# Altium footprint library TarabusLib_KOR.PcbLib: 560 footprints (part 32 of 35)
Each footprint in its own frame and in the unit in brackets; x right, y up, seen from the top. Pads: shape width x height; smd on the part's side, far side on the other; paste and mask are expansions set on the pad; w line width, h text height; cw(c..) or ccw(c..) is an arc to the next point about the centre after c.
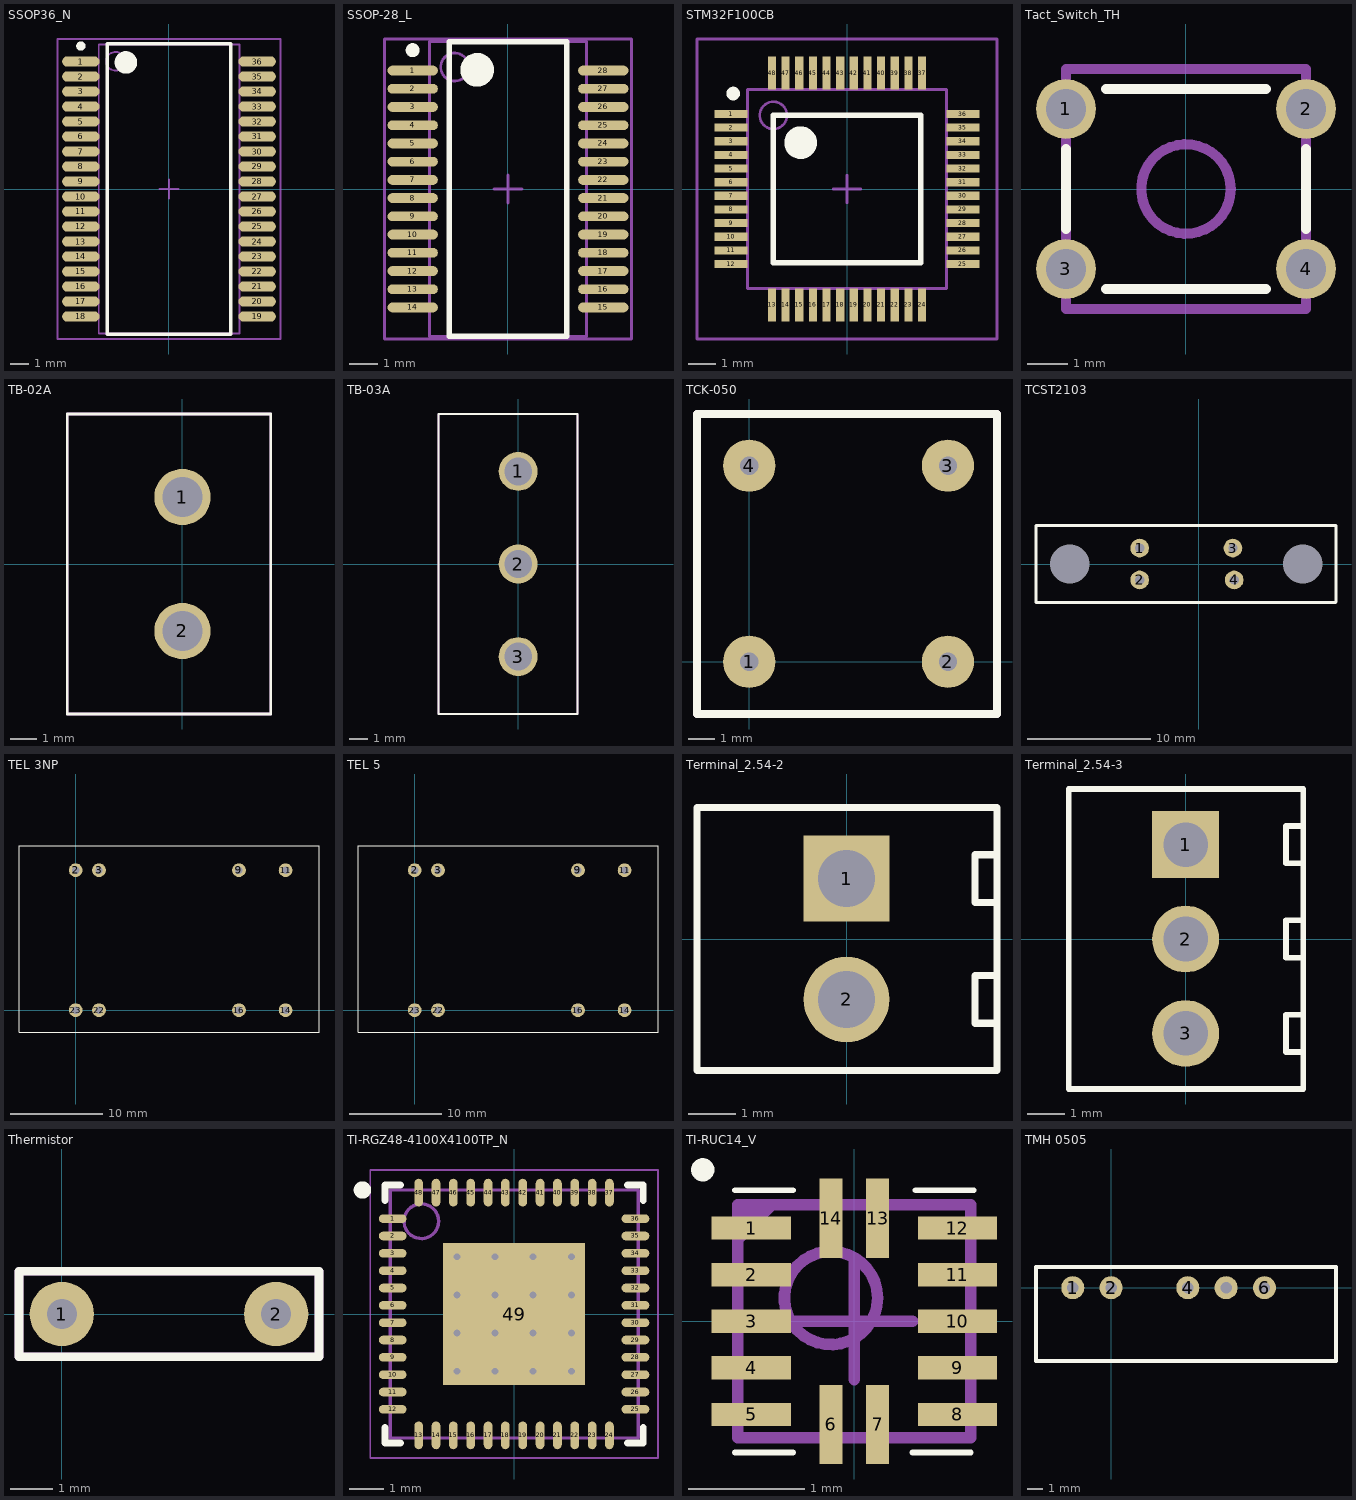
[diagram p31: the footprints below, top view; thin cyan lines are the x and y axes]

## SSOP36_N [mm] "36-Pin Small Outline Package 0.8 mm Pitch, IPC Medium Density"
height 2.65
pads (36):
  oval 2x0.55 smd: 1(-4.7,6.8) 2(-4.7,6) 3(-4.7,5.2) 4(-4.7,4.4) 5(-4.7,3.6) 6(-4.7,2.8) 7(-4.7,2) 8(-4.7,1.2) 9(-4.7,0.4) 10(-4.7,-0.4) 11(-4.7,-1.2) 12(-4.7,-2) 13(-4.7,-2.8) 14(-4.7,-3.6) 15(-4.7,-4.4) 16(-4.7,-5.2) 17(-4.7,-6) 18(-4.7,-6.8) 19(4.7,-6.8) 20(4.7,-6) 21(4.7,-5.2) 22(4.7,-4.4) 23(4.7,-3.6) 24(4.7,-2.8) 25(4.7,-2) 26(4.7,-1.2) 27(4.7,-0.4) 28(4.7,0.4) 29(4.7,1.2) 30(4.7,2) 31(4.7,2.8) 32(4.7,3.6) 33(4.7,4.4) 34(4.7,5.2) 35(4.7,6) 36(4.7,6.8)
Top Overlay:
  circle w0.25: c-4.7,7.625 r0.125
  circle w0.6: c-2.3,6.75 r0.3
  lines w0.2: -3.3,-7.75 -3.3,7.75 3.3,7.75 3.3,-7.75 -3.3,-7.75
Mechanical 13:
  circle w0.1: c-2.85,6.81 r0.5
  lines w0.1: -3.75,-7.71 -3.75,7.71 3.75,7.71 3.75,-7.71 -3.75,-7.71
Mechanical 15:
  lines w0.1: -0.5,0 0.5,0 ; 0,-0.5 0,0.5 ; -5.95,-8 -5.95,8 5.95,8 5.95,-8 -5.95,-8
3D body: height 2.65, standoff 0, extent -3.75,-7.71 3.75,7.71

## SSOP-28_L [mm] "SOP, 28-Leads, Body 10.2x5.3mm, Pitch 0.65mm, IPC High Density"
height 2
pads (28):
  oval 1.8x0.35 smd: 1(-3.4,4.225) 2(-3.4,3.575) 3(-3.4,2.925) 4(-3.4,2.275) 5(-3.4,1.625) 6(-3.4,0.975) 7(-3.4,0.325) 8(-3.4,-0.325) 9(-3.4,-0.975) 10(-3.4,-1.625) 11(-3.4,-2.275) 12(-3.4,-2.925) 13(-3.4,-3.575) 14(-3.4,-4.225) 15(3.4,-4.225) 16(3.4,-3.575) 17(3.4,-2.925) 18(3.4,-2.275) 19(3.4,-1.625) 20(3.4,-0.975) 21(3.4,-0.325) 22(3.4,0.325) 23(3.4,0.975) 24(3.4,1.625) 25(3.4,2.275) 26(3.4,2.925) 27(3.4,3.575) 28(3.4,4.225)
Top Overlay:
  circle w0.25: c-3.4,4.95 r0.125
  circle w0.6: c-1.1,4.25 r0.3
  lines w0.2: -2.1,-5.25 -2.1,5.25 2.1,5.25 2.1,-5.25 -2.1,-5.25
Mechanical 13:
  circle w0.1: c-1.9,4.35 r0.5
  lines w0.1: -2.8,-5.25 -2.8,5.25 2.8,5.25 2.8,-5.25 -2.8,-5.25
Mechanical 15:
  lines w0.1: -0.5,0 0.5,0 ; 0,-0.5 0,0.5 ; -4.4,-5.35 -4.4,5.35 4.4,5.35 4.4,-5.35 -4.4,-5.35
3D body "User Library-SSOP-28-2.STEP": height 1.95, standoff -0.05, extent -3.906,-5.075 3.906,5.125

## STM32F100CB [mm] "TSQFP, 48-Leads, Body 9,7x9,7mm (max), Pitch 0,50mm, IPC Medium Density"
height 1.6
pads (48):
  rect 1.2x0.3 smd: 1(-4.25,2.75) 2(-4.25,2.25) 3(-4.25,1.75) 4(-4.25,1.25) 5(-4.25,0.75) 6(-4.25,0.25) 7(-4.25,-0.25) 8(-4.25,-0.75) 9(-4.25,-1.25) 10(-4.25,-1.75) 11(-4.25,-2.25) 12(-4.25,-2.75) 25(4.25,-2.75) 26(4.25,-2.25) 27(4.25,-1.75) 28(4.25,-1.25) 29(4.25,-0.75) 30(4.25,-0.25) 31(4.25,0.25) 32(4.25,0.75) 33(4.25,1.25) 34(4.25,1.75) 35(4.25,2.25) 36(4.25,2.75)
  rect 0.3x1.2 smd: 13(-2.75,-4.25) 14(-2.25,-4.25) 15(-1.75,-4.25) 16(-1.25,-4.25) 17(-0.75,-4.25) 18(-0.25,-4.25) 19(0.25,-4.25) 20(0.75,-4.25) 21(1.25,-4.25) 22(1.75,-4.25) 23(2.25,-4.25) 24(2.75,-4.25) 37(2.75,4.25) 38(2.25,4.25) 39(1.75,4.25) 40(1.25,4.25) 41(0.75,4.25) 42(0.25,4.25) 43(-0.25,4.25) 44(-0.75,4.25) 45(-1.25,4.25) 46(-1.75,4.25) 47(-2.25,4.25) 48(-2.75,4.25)
Top Overlay:
  circle w0.25: c-4.175,3.5 r0.125
  circle w0.6: c-1.7,1.7 r0.3
  lines w0.2: -2.7,-2.7 -2.7,2.7 2.7,2.7 2.7,-2.7 -2.7,-2.7
Mechanical 13:
  circle w0.1: c-2.7,2.7 r0.5
  lines w0.1: -3.65,-3.65 -3.65,3.65 3.65,3.65 3.65,-3.65 -3.65,-3.65
Mechanical 15:
  lines w0.1: -0.5,0 0.5,0 ; 0,-0.5 0,0.5 ; -5.5,-5.5 -5.5,5.5 5.5,5.5 5.5,-5.5 -5.5,-5.5
3D body: height 1.6, standoff 0.05, extent -3.65,-3.65 3.65,3.65

## Tact_Switch_TH [mm]
height 5
pads (4):
  round 1.5 hole 1 mask+0.075: 1(-3,2) 2(3,2) 3(-3,-2) 4(3,-2)
Top Overlay:
  lines w0.254: -3,-1 -3,1 ; -2,-2.5 2,-2.5 ; -2,2.5 2,2.5 ; 3,-1 3,1
Mechanical 9:
  circle w0.254: c0,0 r1.118
  lines w0.254: -3,-3 3,-3 3,3 -3,3 -3,-3
3D body: height 4, standoff 0, extent -1.118,-1.118 1.118,1.118
3D body: height 3.5, standoff 0.05, extent -3,-3 3,3

## TB-02A [mm]
pads (2):
  round 2.1 hole 1.5: 1(0,2.5) 2(0,-2.5)
Top Overlay:
  lines w0.1: -4.3,-5.6 3.3,-5.6 3.3,5.6 -4.3,5.6 -4.3,-5.6
Mechanical 7:
  lines w0.1: -4.3,-5.6 3.3,-5.6 3.3,5.6 -4.3,5.6 -4.3,-5.6
3D body "c-1776244-2-o-3d.stp": height 10, standoff -3.5, extent -4.25,-5.58 3.25,5.58

## TB-03A [mm]
pads (3):
  round 2.1 hole 1.5: 1(0,5) 2(0,0) 3(0,-5)
Top Overlay:
  lines w0.1: -4.3,-8.1 3.2,-8.1 3.2,8.1 -4.3,8.1 -4.3,-8.1
Mechanical 7:
  lines w0.1: -4.3,-8.1 3.2,-8.1 3.2,8.1 -4.3,8.1 -4.3,-8.1
3D body "c-1776244-3-o-3d.stp": height 10, standoff -3.5, extent -4.3,-8.08 3.2,8.08

## TCK-050 [mm]
pads (4):
  round 2 hole 0.7: 1(0,0) 2(7.62,0) 3(7.62,7.52) 4(0,7.52)
Top Overlay:
  lines w0.3: -2,-2 9.5,-2 9.5,9.5 -2,9.5 -2,-2
Mechanical 7:
  lines w0.3: -2,-2 9.5,-2 9.5,9.5 -2,9.5 -2,-2
Mechanical 10:
  text ".Designator" at 6.5,11 h0.8
  text ".Comment" at 6.5,10 h0.6
3D body: height 8.8, standoff 0, extent -2,-2 9.5,9.5

## TCST2103 [mil]
pads (6):
  round 60 hole 30: 1(-188.98,51.18) 2(-188.98,-51.18) 3(110.24,51.18) 4(114.17,-51.18)
  round 60 hole 125.98 unplated: ""(-413.39,0) ""(334.65,0)
Top Overlay:
  lines w10: -521.65,-124.01 -521.65,124.02 440.94,124.02 440.94,-122.05 438.98,-124.01 -521.65,-124.01
3D body "TCST2103, Оптопара.STEP": height 437.01, standoff -307.09, extent -521.65,-124.01 442.92,124.02

## TEL 3NP [mm] "Traco Power DC/DC converter"
height 10.5
pads (8):
  round 1.5 hole 0.81: 2(0,15.24) 3(2.54,15.24) 9(17.78,15.24) 11(22.86,15.24) 14(22.86,0) 16(17.78,0) 22(2.54,0) 23(0,0)
Top Overlay:
  lines w0.1: -6.175,-2.4 26.5,-2.4 26.5,17.9 -6.175,17.9 -6.175,-2.4
3D body "TEL 3-1211NP.STEP": height 10.2, standoff -4.5, extent -5.8,-2.375 26.2,17.625

## TEL 5 [mm] "Traco Power DC/DC converter"
height 10.5
pads (8):
  round 1.5 hole 0.81: 2(0,15.24) 3(2.54,15.24) 9(17.78,15.24) 11(22.86,15.24) 14(22.86,0) 16(17.78,0) 22(2.54,0) 23(0,0)
Top Overlay:
  lines w0.1: -6.175,-2.4 -6.175,17.9 26.5,17.9 26.5,-2.4 -6.175,-2.4
3D body "TEL 3-1211NP.STEP": height 10.2, standoff -4.5, extent -5.8,-2.375 26.2,17.625

## Terminal_2.54-2 [mm]
height 8.5
pads (2):
  rect 1.8x1.8 hole 1.2: 1(0,1.27)
  round 1.8 hole 1.2: 2(0,-1.27)
Top Overlay:
  lines w0.15: 3.16,-1.77 2.7,-1.77 2.7,-0.77 3.16,-0.77 ; 3.16,0.77 2.7,0.77 2.7,1.77 3.16,1.77 ; -3.14,-2.765 -3.14,2.765 3.16,2.765 3.16,-2.765 -3.14,-2.765
Mechanical 9:
  text ".Comment" at -1.15,3.275 h0.6
  text ".Designator" at -1.175,3.975 h0.8
Mechanical 11:
  lines w0.1: 3.16,-1.77 2.7,-1.77 2.7,-0.77 3.16,-0.77 ; 3.16,0.77 2.7,0.77 2.7,1.77 3.16,1.77 ; -3.14,-2.765 3.16,-2.765 3.16,2.765 -3.14,2.765 -3.14,-2.765
3D body "terminal 2_54x2.STEP": height 8.5, standoff -3.5, extent -3.075,-2.775 3.125,2.765

## Terminal_2.54-3 [mm]
height 8.5
pads (3):
  rect 1.8x1.8 hole 1.2: 1(0,2.54)
  round 1.8 hole 1.2: 2(0,0) 3(0,-2.54)
Top Overlay:
  lines w0.15: 3.16,-3.04 2.7,-3.04 2.7,-2.04 3.16,-2.04 ; 3.16,-0.5 2.7,-0.5 2.7,0.5 3.16,0.5 ; 3.16,2.04 2.7,2.04 2.7,3.04 3.16,3.04 ; -3.14,-4.035 -3.14,4.035 3.16,4.035 3.16,-4.035 -3.14,-4.035
Mechanical 9:
  text ".Comment" at -1.15,4.545 h0.6
  text ".Designator" at -1.175,5.245 h0.8
Mechanical 11:
  lines w0.1: 3.16,-3.04 2.7,-3.04 2.7,-2.04 3.16,-2.04 ; 3.16,-0.5 2.7,-0.5 2.7,0.5 3.16,0.5 ; 3.16,2.04 2.7,2.04 2.7,3.04 3.16,3.04 ; -3.14,-4.035 3.16,-4.035 3.16,4.035 -3.14,4.035 -3.14,-4.035
3D body "terminal 2_54x3.stp": height 8.5, standoff -3.5, extent -3.1,-4.04 3.1,4.04

## Thermistor [mm]
pads (2):
  round 1.5 hole 0.7: 1(0,0) 2(5,0)
Top Overlay:
  lines w0.2: -1,-1 6,-1 6,1 -1,1 -1,-1
Mechanical 7:
  lines w0.2: -1,-1 -1,1 6,1 6,-1 -1,-1
Mechanical 10:
  text ".Designator" at 2.57,1.53 h0.8
  text ".Comment" at 3.58,-1.79 h0.6

## TI-RGZ48-4100X4100TP_N [mm] "QFN, 48-Leads, Body 7x7mm, Pitch 0.5mm, Thermal Pad 4.1x4.1mm, IPC Medium Density"
height 1
pads (49):
  oval 0.8x0.25 smd: 1(-3.5,2.75) 2(-3.5,2.25) 3(-3.5,1.75) 4(-3.5,1.25) 5(-3.5,0.75) 6(-3.5,0.25) 7(-3.5,-0.25) 8(-3.5,-0.75) 9(-3.5,-1.25) 10(-3.5,-1.75) 11(-3.5,-2.25) 12(-3.5,-2.75) 25(3.5,-2.75) 26(3.5,-2.25) 27(3.5,-1.75) 28(3.5,-1.25) 29(3.5,-0.75) 30(3.5,-0.25) 31(3.5,0.25) 32(3.5,0.75) 33(3.5,1.25) 34(3.5,1.75) 35(3.5,2.25) 36(3.5,2.75)
  oval 0.25x0.8 smd: 13(-2.75,-3.5) 14(-2.25,-3.5) 15(-1.75,-3.5) 16(-1.25,-3.5) 17(-0.75,-3.5) 18(-0.25,-3.5) 19(0.25,-3.5) 20(0.75,-3.5) 21(1.25,-3.5) 22(1.75,-3.5) 23(2.25,-3.5) 24(2.75,-3.5) 37(2.75,3.5) 38(2.25,3.5) 39(1.75,3.5) 40(1.25,3.5) 41(0.75,3.5) 42(0.25,3.5) 43(-0.25,3.5) 44(-0.75,3.5) 45(-1.25,3.5) 46(-1.75,3.5) 47(-2.25,3.5) 48(-2.75,3.5)
  rect 4.1x4.1 smd: 49(0,0)
via -1.65,1.65 diameter 0.5 hole 0.2
via -0.55,1.65 diameter 0.5 hole 0.2
via 0.55,1.65 diameter 0.5 hole 0.2
via 1.65,1.65 diameter 0.5 hole 0.2
via -1.65,0.55 diameter 0.5 hole 0.2
via -0.55,0.55 diameter 0.5 hole 0.2
via 0.55,0.55 diameter 0.5 hole 0.2
via 1.65,0.55 diameter 0.5 hole 0.2
via -1.65,-0.55 diameter 0.5 hole 0.2
via -0.55,-0.55 diameter 0.5 hole 0.2
via 0.55,-0.55 diameter 0.5 hole 0.2
via 1.65,-0.55 diameter 0.5 hole 0.2
via -1.65,-1.65 diameter 0.5 hole 0.2
via -0.55,-1.65 diameter 0.5 hole 0.2
via 0.55,-1.65 diameter 0.5 hole 0.2
via 1.65,-1.65 diameter 0.5 hole 0.2
Top Overlay:
  circle w0.25: c-4.375,3.575 r0.125
  lines w0.2: -3.725,-3.275 -3.725,-3.725 -3.275,-3.725 ; -3.725,3.275 -3.725,3.725 -3.275,3.725 ; 3.275,-3.725 3.725,-3.725 3.725,-3.275 ; 3.275,3.725 3.725,3.725 3.725,3.275
Mechanical 13:
  circle w0.1: c-2.675,2.675 r0.5
  lines w0.1: -3.575,-3.575 -3.575,3.575 3.575,3.575 3.575,-3.575 -3.575,-3.575
Mechanical 15:
  lines w0.05: -4.15,-4.15 -4.15,4.15 4.15,4.15 4.15,-4.15 -4.15,-4.15
  lines w0.1: -0.5,0 0.5,0 ; 0,-0.5 0,0.5
3D body: height 1, standoff 0, extent -3.575,-3.575 3.575,3.575

## TI-RUC14_V [mm] "QFN, 14-Leads, Body 2x2mm, Pitch 0.4mm"
height 0.4
pads (14):
  rect 0.68x0.2 smd mask+0.075: 1(-0.885,0.8) 2(-0.885,0.4) 3(-0.885,0) 4(-0.885,-0.4) 5(-0.885,-0.8) 8(0.885,-0.8) 9(0.885,-0.4) 10(0.885,0) 11(0.885,0.4) 12(0.885,0.8)
  rect 0.2x0.68 smd mask+0.075: 6(-0.2,-0.885) 7(0.2,-0.885) 13(0.2,0.885) 14(-0.2,0.885)
Top Overlay:
  circle w0.1: c-1.3,1.3 r0.05
  lines w0.05: -1.025,-1.125 -0.525,-1.125 ; -1.025,1.125 -0.525,1.125 ; 0.5,-1.125 1,-1.125 ; 0.525,1.125 1.025,1.125
Mechanical 7:
  lines w0.05: -0.985,0.684 -0.68,0.989 ; -1,-1 1,-1 1,1 -1,1 -1,-1
  lines w0.1: -0.956,0.764 -0.76,0.96 ; -0.956,0.819 -0.803,0.972 ; -0.956,0.919 -0.915,0.96 ; -0.5,0 0.5,0 ; 0,-0.5 0,0.5
Mechanical 9:
  circle w0.1: c-0.2,0.2 r0.4
  lines w0.1: -1,-1 -1,1 1,1 1,-1 -1,-1
Mechanical 10:
  text ".Designator" at -0.875,-1.725 h0.6
  text ".Comment" at -0.76,1.625 h0.6
3D body: height 0.4, standoff 0, extent -1,-1 1,1

## TMH 0505 [mil]
height 44.09
pads (5):
  round 60 hole 30: 1(-100,0) 2(0,0) 4(200,0) 6(400,0) ""(300,0)
Top Overlay:
  lines w10: -195.87,-190.94 -195.87,53.94 586.62,53.94 586.62,-190.94 -195.87,-190.94
3D body "TMA0505S.STEP": height 393.7, standoff -133.86, extent -198.86,-181 568.86,55.22